# Altium footprint library PCB贴片元件封装库.pcblib: 366 footprints (part 19 of 23)
Each footprint in its own frame and in the unit in brackets; x right, y up, seen from the top. Pads: shape width x height; smd on the part's side, far side on the other; paste and mask are expansions set on the pad; w line width, h text height; cw(c..) or ccw(c..) is an arc to the next point about the centre after c.
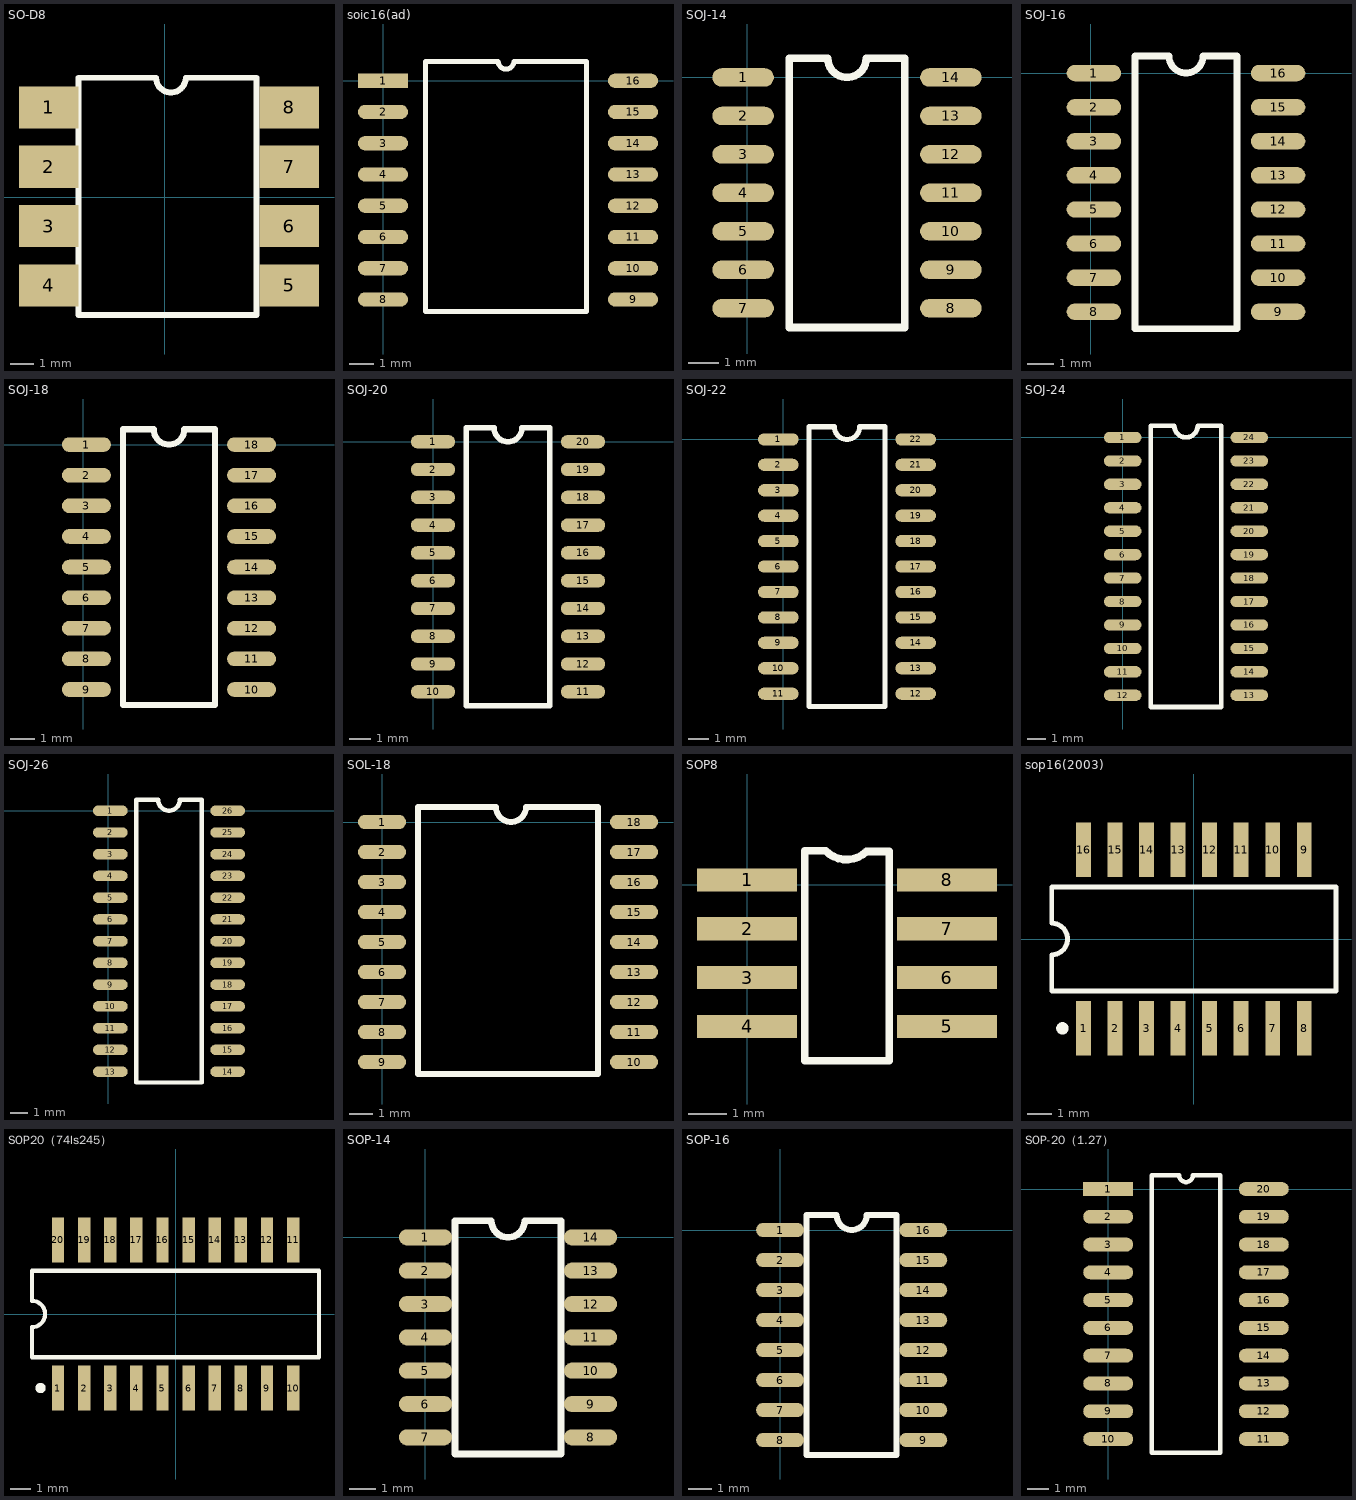
[diagram p18: the footprints below, top view; thin cyan lines are the x and y axes]

## SO-D8 [mil]
pads (8):
  rect 100x70.87 smd: 1(-196,151) 2(-196,51) 3(-196,-49) 4(-196,-149) 5(209.51,-149) 6(209.51,-49) 7(209.51,51) 8(209.51,151)
TopOverlay:
  lines w10: -146,-199 154,-199 154,201 35,201 cw(c10,201) -15,201 -146,201 -146,-199

## soic16(ad) [mil]
pads (16):
  rect 80x23 smd: 1(0,0)
  oval 80x23 smd: 2(0,-50) 3(0,-100) 4(0,-150) 5(0,-200) 6(0,-250) 7(0,-300) 8(0,-350) 9(400,-350) 10(400,-300) 11(400,-250) 12(400,-200) 13(400,-150) 14(400,-100) 15(400,-50) 16(400,0)
TopOverlay:
  lines w7.87: 68.31,-369 68.31,31 184.35,31 ccw(c196.85,31) 209.35,31 325.39,31 325.39,-369 68.31,-369

## SOJ-14 [mil]
pads (14):
  oval 80x24 smd: 1(-5,0) 2(-5,-50) 3(-5,-100) 4(-5,-150) 5(-5,-200) 6(-5,-250) 7(-5,-300) 8(265,-300) 9(265,-250) 10(265,-200) 11(265,-150) 12(265,-100) 13(265,-50) 14(265,0)
TopOverlay:
  lines w10: 55,-325 205,-325 205,25 155,25 cw(c130,25) 105,25 55,25 55,-325

## SOJ-16 [mil]
pads (16):
  oval 80x24 smd: 1(5,0) 2(5,-50) 3(5,-100) 4(5,-150) 5(5,-200) 6(5,-250) 7(5,-300) 8(5,-350) 9(275,-350) 10(275,-300) 11(275,-250) 12(275,-200) 13(275,-150) 14(275,-100) 15(275,-50) 16(275,0)
TopOverlay:
  lines w10: 65,-375 215,-375 215,25 165,25 cw(c140,25) 115,25 65,25 65,-375

## SOJ-18 [mil]
pads (18):
  oval 80x24 smd: 1(5,0) 2(5,-50) 3(5,-100) 4(5,-150) 5(5,-200) 6(5,-250) 7(5,-300) 8(5,-350) 9(5,-400) 10(275,-400) 11(275,-350) 12(275,-300) 13(275,-250) 14(275,-200) 15(275,-150) 16(275,-100) 17(275,-50) 18(275,0)
TopOverlay:
  lines w10: 65,-425 215,-425 215,25 165,25 cw(c140,25) 115,25 65,25 65,-425

## SOJ-20 [mil]
pads (20):
  oval 80x24 smd: 1(0,0) 2(0,-50) 3(0,-100) 4(0,-150) 5(0,-200) 6(0,-250) 7(0,-300) 8(0,-350) 9(0,-400) 10(0,-450) 11(270,-450) 12(270,-400) 13(270,-350) 14(270,-300) 15(270,-250) 16(270,-200) 17(270,-150) 18(270,-100) 19(270,-50) 20(270,0)
TopOverlay:
  lines w10: 60,-475 60,25 110,25 ccw(c135,25) 160,25 210,25 210,-475 60,-475

## SOJ-22 [mil]
pads (22):
  oval 80x24 smd: 1(-10,0) 2(-10,-50) 3(-10,-100) 4(-10,-150) 5(-10,-200) 6(-10,-250) 7(-10,-300) 8(-10,-350) 9(-10,-400) 10(-10,-450) 11(-10,-500) 12(260,-500) 13(260,-450) 14(260,-400) 15(260,-350) 16(260,-300) 17(260,-250) 18(260,-200) 19(260,-150) 20(260,-100) 21(260,-50) 22(260,0)
TopOverlay:
  lines w10: 50,-525 200,-525 200,25 150,25 cw(c125,25) 100,25 50,25 50,-525

## SOJ-24 [mil]
pads (24):
  oval 80x24 smd: 1(0,0) 2(0,-50) 3(0,-100) 4(0,-150) 5(0,-200) 6(0,-250) 7(0,-300) 8(0,-350) 9(0,-400) 10(0,-450) 11(0,-500) 12(0,-550) 13(270,-550) 14(270,-500) 15(270,-450) 16(270,-400) 17(270,-350) 18(270,-300) 19(270,-250) 20(270,-200) 21(270,-150) 22(270,-100) 23(270,-50) 24(270,0)
TopOverlay:
  lines w10: 60,-575 60,25 110,25 ccw(c135,25) 160,25 210,25 210,-575 60,-575

## SOJ-26 [mil]
pads (26):
  oval 80x24 smd: 1(5,0) 2(5,-50) 3(5,-100) 4(5,-150) 5(5,-200) 6(5,-250) 7(5,-300) 8(5,-350) 9(5,-400) 10(5,-450) 11(5,-500) 12(5,-550) 13(5,-600) 14(275,-600) 15(275,-550) 16(275,-500) 17(275,-450) 18(275,-400) 19(275,-350) 20(275,-300) 21(275,-250) 22(275,-200) 23(275,-150) 24(275,-100) 25(275,-50) 26(275,0)
TopOverlay:
  lines w10: 65,-625 65,25 115,25 ccw(c140,25) 165,25 215,25 215,-625 65,-625

## SOL-18 [mil]
pads (18):
  oval 80x24 smd: 1(0,0) 2(0,-50) 3(0,-100) 4(0,-150) 5(0,-200) 6(0,-250) 7(0,-300) 8(0,-350) 9(0,-400) 10(420,-400) 11(420,-350) 12(420,-300) 13(420,-250) 14(420,-200) 15(420,-150) 16(420,-100) 17(420,-50) 18(420,0)
TopOverlay:
  lines w10: 60,-420 60,25 190,25 ccw(c215,25) 240,25 360,25 360,-420 60,-420

## SOP8 [mm] "Small Outline; 8 Leads; Body Width 4.3 mm; Pitch 1.27 mm"
height 1.5
pads (8):
  rect 2.6x0.6 smd: 1(-0.009,0.127) 2(-0.009,-1.143) 3(-0.009,-2.413) 4(-0.009,-3.683) 5(5.191,-3.683) 6(5.191,-2.413) 7(5.191,-1.143) 8(5.191,0.127)
TopOverlay:
  lines w0.2: 1.491,-4.572 3.691,-4.572 3.691,0.864 3.099,0.864 cw(c2.578,1.41) 2.032,0.889 1.491,0.889 1.491,-4.572

## sop16(2003) [mm] "Small Outline; 16 Leads; Body Width 5.6 mm; Pitch 1.27 mm"
height 2
pads (16):
  rect 0.6x2.2 smd: 1(-4.445,-3.6) 2(-3.175,-3.6) 3(-1.905,-3.6) 4(-0.635,-3.6) 5(0.635,-3.6) 6(1.905,-3.6) 7(3.175,-3.6) 8(4.445,-3.6) 9(4.445,3.6) 10(3.175,3.6) 11(1.905,3.6) 12(0.635,3.6) 13(-0.635,3.6) 14(-1.905,3.6) 15(-3.175,3.6) 16(-4.445,3.6)
TopOverlay:
  circle w0.25: c-5.295,-3.6 r0.125
  lines w0.2: -5.725,-2.1 5.725,-2.1 5.725,2.1 -5.725,2.1 -5.725,0.635 cw(c-5.725,0) -5.725,-0.635 -5.725,-2.1

## SOP20（74ls245） [mm] "Small Outline; 20 Leads; Body Width 5.6 mm; Pitch 1.27 mm"
height 2
pads (20):
  rect 0.6x2.2 smd: 1(-5.715,-3.6) 2(-4.445,-3.6) 3(-3.175,-3.6) 4(-1.905,-3.6) 5(-0.635,-3.6) 6(0.635,-3.6) 7(1.905,-3.6) 8(3.175,-3.6) 9(4.445,-3.6) 10(5.715,-3.6) 11(5.715,3.6) 12(4.445,3.6) 13(3.175,3.6) 14(1.905,3.6) 15(0.635,3.6) 16(-0.635,3.6) 17(-1.905,3.6) 18(-3.175,3.6) 19(-4.445,3.6) 20(-5.715,3.6)
TopOverlay:
  circle w0.25: c-6.565,-3.6 r0.125
  lines w0.2: -6.975,-2.1 6.975,-2.1 6.975,2.1 -6.975,2.1 -6.975,0.635 cw(c-6.975,0) -6.975,-0.635 -6.975,-2.1

## SOP-14 [mil]
pads (14):
  oval 80x24 smd: 1(0,0) 2(0,-50) 3(0,-100) 4(0,-150) 5(0,-200) 6(0,-250) 7(0,-300) 8(247.56,-300) 9(247.56,-250) 10(247.56,-200) 11(247.56,-150) 12(247.56,-100) 13(247.56,-50) 14(247.56,0)
TopOverlay:
  lines w10: 44.25,-325 203.31,-325 203.31,25 148.78,25 cw(c123.78,25) 98.78,25 44.25,25 44.25,-325

## SOP-16 [mil]
pads (16):
  oval 80x24 smd: 1(0,0) 2(0,-50) 3(0,-100) 4(0,-150) 5(0,-200) 6(0,-250) 7(0,-300) 8(0,-350) 9(238.5,-350) 10(238.5,-300) 11(238.5,-250) 12(238.5,-200) 13(238.5,-150) 14(238.5,-100) 15(238.5,-50) 16(238.5,0)
TopOverlay:
  lines w10: 44.25,-375 194.25,-375 194.25,25 144.25,25 cw(c119.25,25) 94.25,25 44.25,25 44.25,-375

## SOP-20（1.27） [mil]
pads (20):
  rect 90x25 smd: 1(0,0)
  oval 90x25 smd: 2(0,-50) 3(0,-100) 4(0,-150) 5(0,-200) 6(0,-250) 7(0,-300) 8(0,-350) 9(0,-400) 10(0,-450) 11(280,-450) 12(280,-400) 13(280,-350) 14(280,-300) 15(280,-250) 16(280,-200) 17(280,-150) 18(280,-100) 19(280,-50) 20(280,0)
TopOverlay:
  lines w8: 78,-475 202,-475 202,25 152.5,25 cw(c140,25) 127.5,25 78,25 78,-475